# Altium footprint library TranDangKhoa-LIB.PcbLib: 1435 footprints (part 86 of 90)
Each footprint in its own frame and in the unit in brackets; x right, y up, seen from the top. Pads: shape width x height; smd on the part's side, far side on the other; paste and mask are expansions set on the pad; w line width, h text height; cw(c..) or ccw(c..) is an arc to the next point about the centre after c.
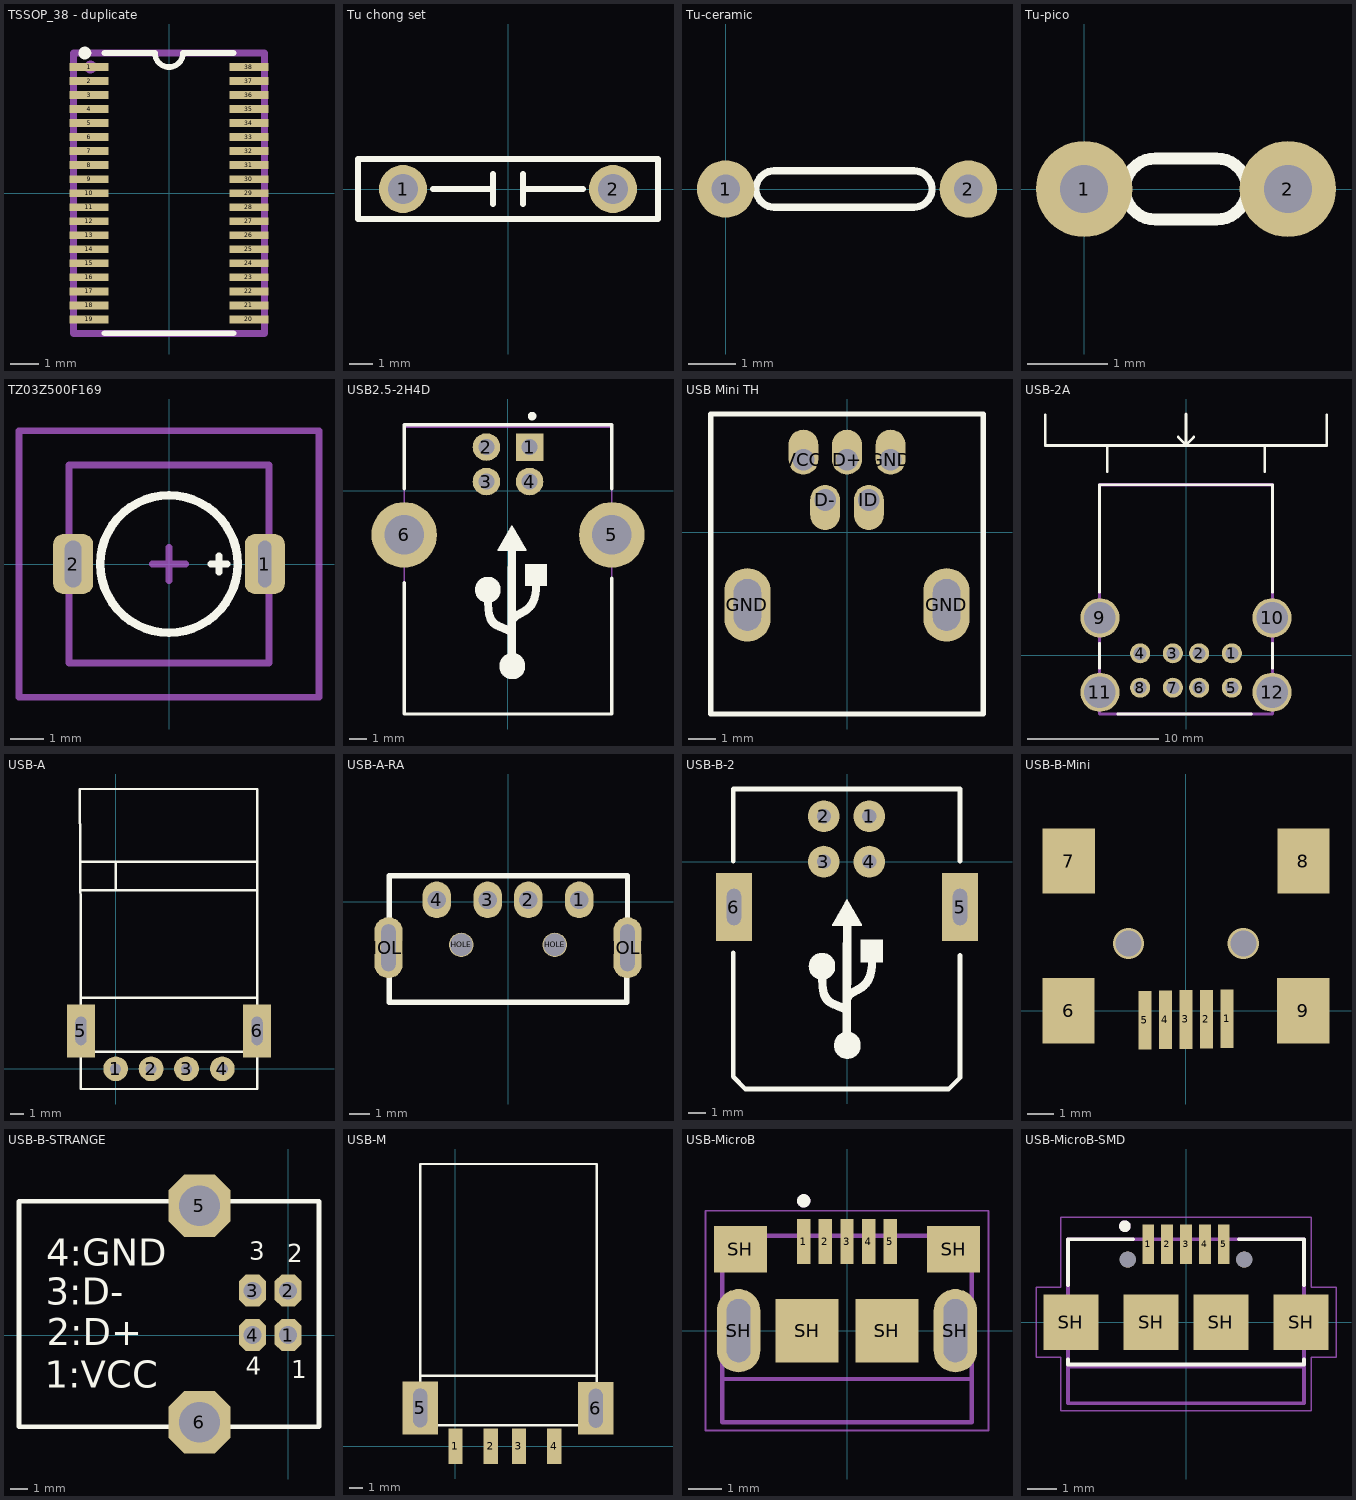
[diagram p85: the footprints below, top view; thin cyan lines are the x and y axes]

## TSSOP_38 - duplicate [mm]
pads (38):
  rect 1.4x0.28 smd mask+0.025: 1(-2.85,4.5) 2(-2.85,4) 3(-2.85,3.5) 4(-2.85,3) 5(-2.85,2.5) 6(-2.85,2) 7(-2.85,1.5) 8(-2.85,1) 9(-2.85,0.5) 10(-2.85,0) 11(-2.85,-0.5) 12(-2.85,-1) 13(-2.85,-1.5) 14(-2.85,-2) 15(-2.85,-2.5) 16(-2.85,-3) 17(-2.85,-3.5) 18(-2.85,-4) 19(-2.85,-4.5) 20(2.85,-4.5) 21(2.85,-4) 22(2.85,-3.5) 23(2.85,-3) 24(2.85,-2.5) 25(2.85,-2) 26(2.85,-1.5) 27(2.85,-1) 28(2.85,-0.5) 29(2.85,0) 30(2.85,0.5) 31(2.85,1) 32(2.85,1.5) 33(2.85,2) 34(2.85,2.5) 35(2.85,3) 36(2.85,3.5) 37(2.85,4) 38(2.85,4.5)
Top Overlay:
  circle w0.254: c-3,5 r0.1
  lines w0.2: -2.3,-5 2.3,-5 ; -2.3,5 -0.5,5 ccw(c-0.001,5) 0.499,5 ; 0.5,5 2.3,5
Mechanical 16:
  circle w0.254: c-2.8,4.5 r0.1
  lines w0.254: -3.4,-5 -3.4,5 3.4,5 3.4,-5 -3.4,-5
Mechanical 29:
  text ".Designator" at -0.5,0.8 h1.52
3D body: height 1.2, standoff 0, extent -2.3,-5 2.3,5

## Tu chong set [mil] "Tu chong set xanh"
pads (2):
  round 80 hole 50: 1(-175,0) 2(175,0)
Top Overlay:
  lines w10: -125,0 -25,0 ; -25,-25 -25,25 ; 25,-25 25,25 ; 25,0 125,0 ; -250,-50 250,-50 250,50 -250,50 -250,-50

## Tu-ceramic [mm] "Tu gom mini"
pads (2):
  round 1.2 hole 0.6: 1(0,0) 2(5.08,0)
Top Overlay:
  lines w0.15: 1.016,-0.381 cw(c1.016,0) 1.016,0.381 3.937,0.381 cw(c3.937,0) 3.937,-0.381 1.016,-0.381
3D body "User Library-Cap 100n.step": height 6.12, standoff -1.8, extent -0.378,-0.848 5.461,0.848

## Tu-pico [mm] "Tu gom mini"
pads (2):
  round 1.2 hole 0.6: 1(0,0) 2(2.54,0)
Top Overlay:
  lines w0.15: 0.889,-0.381 cw(c0.889,0) 0.889,0.381 1.651,0.381 cw(c1.651,0) 1.651,-0.381 0.889,-0.381
3D body "User Library-Cap 100n.step": height 6.12, standoff -1.8, extent -1.647,-0.848 4.191,0.848

## TZ03Z500F169 [mm]
pads (2):
  rrect50% 1.2x1.8 hole 0.4 slot 1.4 at 90 deg unplated mask+0.01: 1(2.875,0)
  rrect50% 1.2x1.8 hole 0.5 slot 1.4 at 90 deg unplated mask+0.01: 2(-2.875,0)
Top Overlay:
  circle w0.254: c0,0 r2.062
  lines w0.2: 1.25,0 1.75,0 ; 1.5,-0.25 1.5,0.25
Mechanical 13:
  lines w0.2: -3,-2.971 3,-2.971 3,2.971 -3,2.971 -3,-2.971
Mechanical 15:
  lines w0.2: -0.5,0 0.5,0 ; 0,-0.5 0,0.5 ; -4.5,-4 4.5,-4 4.5,4 -4.5,4 -4.5,-4
3D body "TZ03Z500F169.STEP": height 6.3, standoff -2, extent -3,-2.971 3,2.971

## USB2.5-2H4D [mm] "Connector; USB1.1, Type B, Thru-Hole; 4 Position; Right Angle"
height 11.1
pads (6):
  rect 1.6x1.6 hole 0.92: 1(1.25,2.546)
  round 1.6 hole 0.92: 2(-1.25,2.546) 3(-1.25,0.546) 4(1.25,0.546)
  round 3.8 hole 2.3: 5(6.02,-2.545) 6(-6.02,-2.545)
Top Overlay:
  drawing of 1147 lines, arcs and shapes, not listed
Mechanical 13:
  lines w0.1: -6.02,-12.932 6.02,-12.932 6.02,3.705 -6.02,3.705 -6.02,-12.932
3D body "Samtec_-USB-B-S-F-B-TH.STEP": height 10.58, standoff -3.64, extent -7.429,-13.059 7.429,3.24

## USB Mini TH [mm] "USB Mini MOLEX 548190519"
height 4
pads (7):
  oval 1.1x1.65 hole 0.8 copper offset 0,0.275: D+(0,2.663) GND(1.6,2.663) VCC(-1.6,2.663)
  oval 1.1x1.65 hole 0.8 copper offset 0,-0.275: D-(-0.8,1.188) ID(0.8,1.188)
  oval 1.7x2.7 hole 1 slot 1.9 at 90 deg: GND(-3.65,-2.662) GND(3.65,-2.662)
Top Overlay:
  lines w0.2: -5,-6.662 -5,4.338 5,4.338 5,-6.662 -5,-6.662
3D body "USB.STEP": height 4, standoff -1.75, extent -3.85,-6.262 3.85,2.738

## USB-2A [mm]
pads (12):
  round 1.524 hole 1: 1(3.5,0.13) 2(1,0.13) 3(-1,0.13) 4(-3.5,0.13) 5(3.5,-2.49) 6(1,-2.49) 7(-1,-2.49) 8(-3.5,-2.49)
  round 3 hole 2.4: 9(-6.57,2.84) 10(6.57,2.84) 11(-6.57,-2.84) 12(6.57,-2.84)
Top Overlay:
  lines w0.2: -10.75,18.35 -10.75,16 10.75,16 10.75,18.35 ; -6.6,-1 -6.6,0.9 ; -6.6,4.8 -6.6,13 6.6,13 6.6,4.8 ; -6,14 -6,16 ; -5.2,-4.5 5,-4.5 ; -0.6,16.65 0,16.05 ; 0,18.4 0,16.05 ; 0.6,16.65 0,16.05 ; 6,14 6,16 ; 6.6,-1 6.6,0.9
Mechanical 16:
  lines w0.254: -6.6,-4.5 -6.6,13 6.6,13 6.6,-4.5 -6.6,-4.5
Mechanical 29:
  text ".Designator" at -2,5.8 h1.52
3D body "c-5787617-1-c-3d.stp": height 15.78, standoff -4.37, extent -8.1,-4.1 8.139,13.08

## USB-A [mil]
pads (6):
  round 70 hole 31: 1(0,0) 2(100,0) 3(200,0) 4(301,0)
  rect 80x150 hole 31 slot 80 at 90 deg: 5(-98,107) 6(399,107)
Top Overlay:
  lines w7: -99,200 400,200 ; -99,504 400,504 ; -99,584 400,584 ; -98,48 401,48 ; 0,504 0,584 ; -101.03,790 -99,397 -99,-57 400,-57 400,790 -101.03,790
3D body "usb_a-usb_a-lp-c.stp": height 177.17, standoff -51.16, extent -97.29,-0.22 399,784.22

## USB-A-RA [mm] "USB Type A"
pads (8):
  oval 1.4x1.8 hole 0.9: 1(3.5,0.08) 2(1,0.08) 3(-1,0.08) 4(-3.5,0.08)
  oval 1.4x3 hole 0.7 slot 2.3 at 90 deg: HOLE(-5.875,-2.27) HOLE(5.875,-2.27)
  round 1.2 hole 1.1: HOLE(-2.3,-2.13) HOLE(2.3,-2.13)
Top Overlay:
  lines w0.254: 5.842,-2.27 5.842,-4.953 -5.842,-4.953 -5.842,1.27 5.875,1.27 5.875,-2.27
Keep-Out Layer:
  lines w0.254: 5.842,-2.27 5.875,-2.27
3D body "Samtec-USB-AM-S-F-B-TH-FlashDrive.step": height 2.18, standoff -3.52, extent -6.25,-19.8 6.25,0.23

## USB-B-2 [mil] "USB B connector, 4pin, For Print"
height 100
pads (6):
  round 70 hole 31: 1(49,100) 2(-51,100) 3(-51,0) 4(49,0)
  rect 80x150 hole 31 slot 80 at 90 deg: 5(249,-100) 6(-249,-100)
Top Overlay:
  drawing of 1149 lines, arcs and shapes, not listed
3D body "usb_a-usbsb.stp": height 421.26, standoff -155.51, extent -294.31,-510 292.31,139.61

## USB-B-Mini [mm]
pads (9):
  rect 0.5x2.25 smd: 1(1.575,-0.305) 2(0.787,-0.318) 3(0,-0.33) 4(-0.787,-0.343) 5(-1.575,-0.356)
  rect 2x2.5 smd: 6(-4.5,0) 7(-4.496,5.74) 8(4.504,5.74) 9(4.5,0)
via 2.2,2.58 diameter 1.2 hole 1
via -2.2,2.58 diameter 1.2 hole 1
3D body "User Library-USB_mini_B.step": height 3.95, standoff -1, extent -5.35,-0.673 5.35,8.527

## USB-B-STRANGE [mm] "USB Type B - STRANGE - Slave Device"
pads (6):
  oct 1.5x1.8 hole 1: 1(0,0) 2(0,2.5) 3(-2,2.5) 4(-2,0)
  oct 3.5x3.5 hole 2.3: 5(-4.988,7.283) 6(-4.988,-4.909)
Top Overlay:
  lines w0.254: -15.148,-5.163 1.743,-5.163 1.743,7.537 -15.148,7.537 -15.148,-5.163
  text "4" at -2.372,-2.242 h1
  text "2" at -0.035,4.108 h1
  text "3" at -2.194,4.235 h1
  text "1" at 0.193,-2.42 h1
  text "4:GND" at -13.624,3.905 h1.52
  text "3:D-" at -13.65,1.695 h1.52
  text "2:D+" at -13.574,-0.565 h1.52
  text "1:VCC" at -13.701,-2.978 h1.52
3D body "Samtec-USB-B-S-F-B-TH-Strange.step": height 10.98, standoff -3.24, extent -15.45,-6.179 0.85,8.68

## USB-M [mil] "For USB SMD"
height 150
pads (6):
  rect 40x100 smd: 1(0,0) 2(100,0) 3(180,0) 4(280,0)
  rect 100x150 hole 40 slot 110 at 90 deg: 5(-100,109) 6(398,108)
Top Overlay:
  lines w7: -100,200 400,200 ; -100,60 -100,800 400,800 400,60 -100,60

## USB-MicroB [mm]
height 3
pads (11):
  rect 0.4x1.35 smd: 1(-1.3,2.675) 2(-0.65,2.675) 3(0,2.675) 4(0.65,2.675) 5(1.3,2.675)
  oval 1.31x2.5 hole 0.71 slot 1.9 at 90 deg: SH(-3.255,0) SH(3.255,0)
  rect 1.6x1.4 smd: SH(-3.2,2.45) SH(3.2,2.45)
  rect 1.9x1.9 smd: SH(-1.2,0) SH(1.2,0)
Top Overlay:
  circle w0.2: c-1.3,3.9 r0.1
Mechanical 13:
  circle w0.2: c-1.3,3.9 r0.1
  lines w0.127: -3.75,-1.45 3.75,-1.45 ; -3.75,-1.45 -3.75,2.85 3.75,2.85 3.75,-1.45 ; -3.75,-1.45 -3.75,-2.75 3.75,-2.75 3.75,-1.45
Mechanical 15:
  lines w0.05: -4.25,-3 -4.25,3.6 4.25,3.6 4.25,-3 -4.25,-3
3D body "step_temp.STEP": height 2.76, standoff -0.8, extent -4,-2.49 4,3.11

## USB-MicroB-SMD [mm]
height 2.95
pads (11):
  rect 0.4x1.35 smd: 1(-1.3,2.675) 2(-0.65,2.675) 3(0,2.675) 4(0.65,2.675) 5(1.3,2.675)
  rect 1.9x1.9 smd: SH(-3.95,0) SH(-1.2,0) SH(1.2,0) SH(3.95,0)
  round 0.55 hole 0.55 unplated: ""(-2,2.15) ""(2,2.15)
Top Overlay:
  circle w0.2: c-2.1,3.3 r0.1
  lines w0.127: -4.05,-1.27 -4.05,-1.45 4.05,-1.45 4.05,-1.27 ; -4.05,1.27 -4.05,2.85 -1.82,2.85 ; 1.82,2.85 4.05,2.85 4.05,1.27
Mechanical 13:
  circle w0.2: c-2.1,3.3 r0.1
  lines w0.127: -4.05,-1.45 -4.05,2.85 4.05,2.85 4.05,-2.78 -4.05,-2.78 -4.05,-1.524 4.064,-1.524
Mechanical 15:
  lines w0.05: -5.15,-1.2 -5.15,1.2 -4.3,1.2 -4.3,3.6 4.3,3.6 4.3,1.2 5.15,1.2 5.15,-1.2 4.3,-1.2 4.3,-3.03 -4.3,-3.03 -4.3,-1.2 -5.15,-1.2
3D body "step_temp.STEP": height 2.65, standoff -0.6, extent -4.05,-1.963 4.05,3.68